# Altium footprint library PcbLibLafe.PcbLib: 294 footprints (part 12 of 19)
Each footprint in its own frame and in the unit in brackets; x right, y up, seen from the top. Pads: shape width x height; smd on the part's side, far side on the other; paste and mask are expansions set on the pad; w line width, h text height; cw(c..) or ccw(c..) is an arc to the next point about the centre after c.
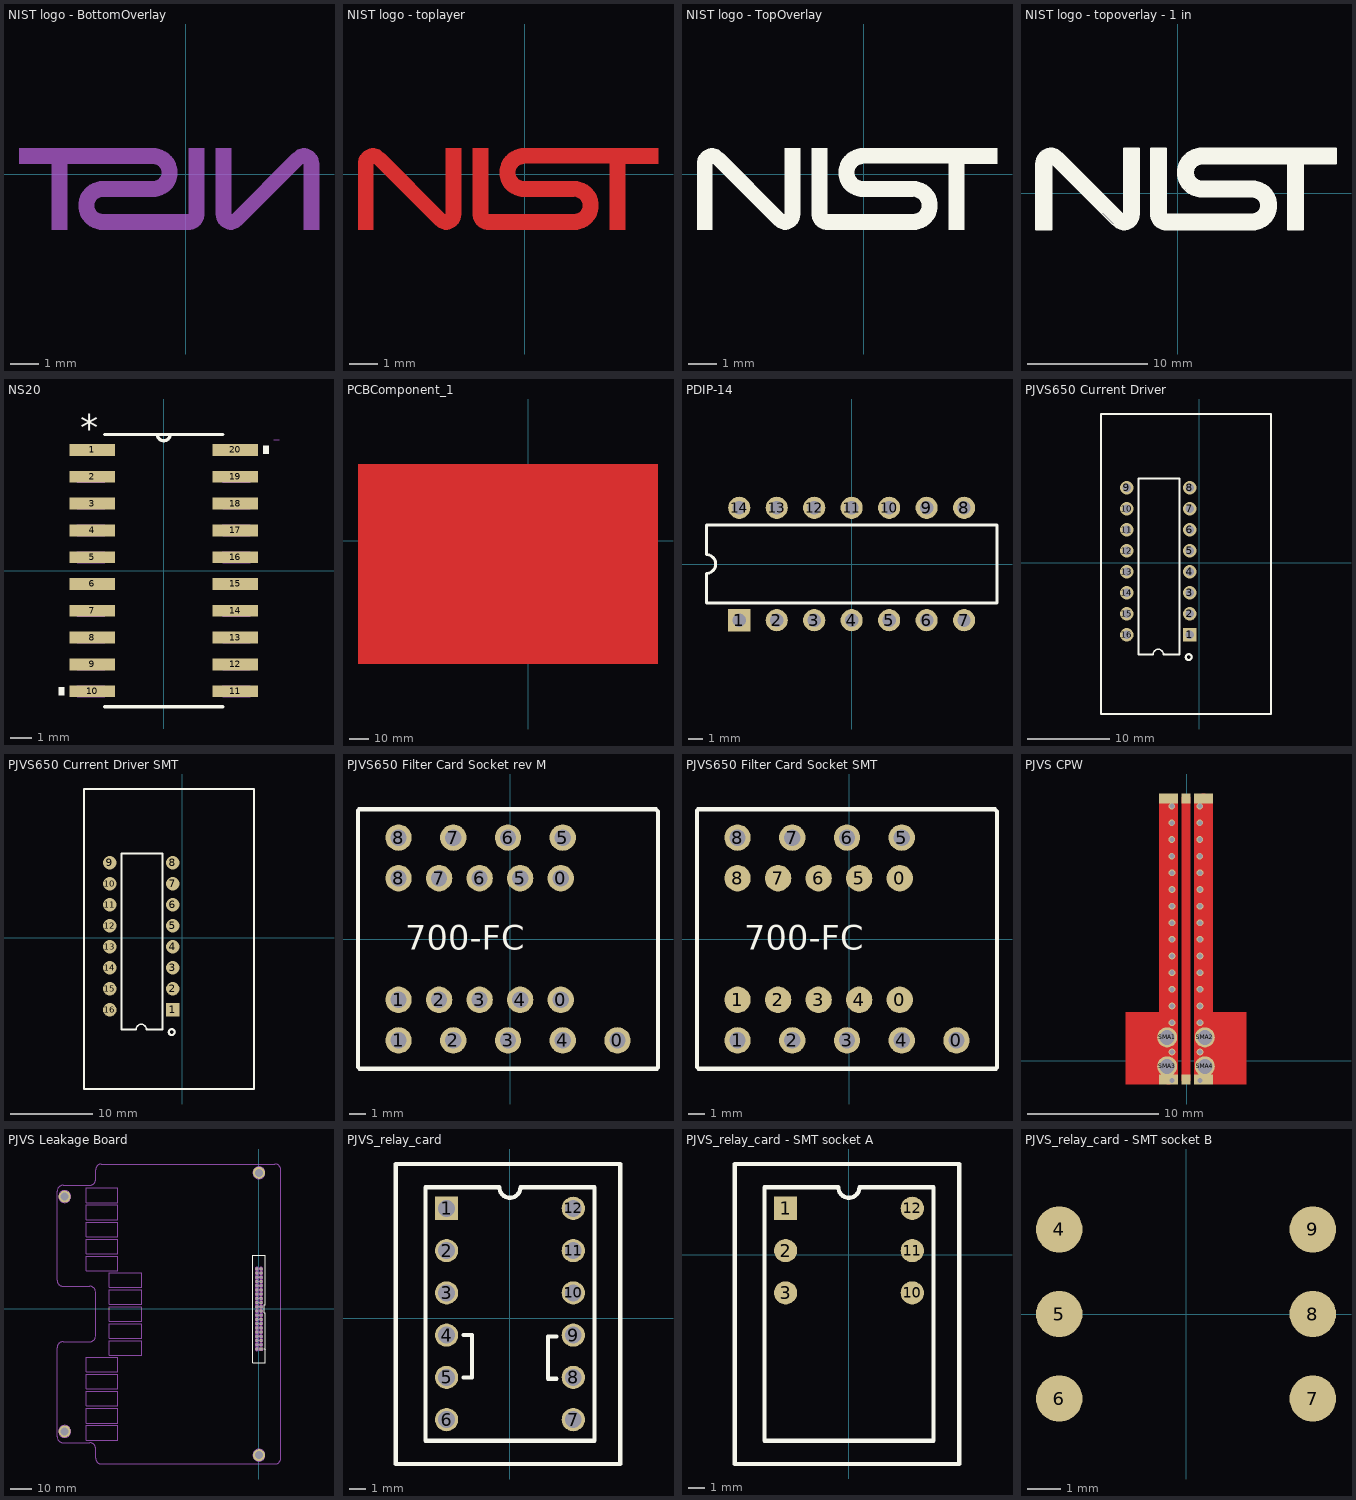
[diagram p11: the footprints below, top view; thin cyan lines are the x and y axes]

## NIST logo - BottomOverlay [mil]
Bottom Overlay:
  drawing of 3 lines, arcs and shapes, not listed

## NIST logo - toplayer [mil]
Top Layer:
  region: -204.1,35.26 -197.82,33.16 -194.53,30.77 -190.33,27.17 -108.73,-54.43 -108.69,-54.45 -86.7,-54.45 -86.76,-55.92 -86.93,-57.44 -87.2,-58.91 -87.56,-60.41 -88.04,-61.84 -88.64,-63.22 -89.3,-64.6 -90.08,-65.88 -90.94,-67.14 -91.9,-68.31 -92.92,-69.44 -94.06,-70.46 -95.22,-71.42 -96.48,-72.29 -97.77,-73.06 -99.14,-73.72 -100.52,-74.32 -101.96,-74.8 -103.45,-75.16 -104.92,-75.43 -106.44,-75.58 -109.58,-75.58 -113.26,-74.44 -117.96,-71.99 -123.51,-67.4 -205.04,14.11 -205.08,14.12 -205.98,14.12 -206.02,14.11 -206.04,14.07 -206.04,-75.64 -227.14,-75.64 -227.14,15.6 -227.02,17.09 -226.75,18.59 -226.36,20.05 -225.88,21.49 -225.31,22.89 -224.62,24.24 -223.85,25.56 -222.98,26.79 -222.05,27.98 -221,29.09 -219.9,30.14 -218.7,31.07 -217.47,31.93 -216.16,32.71 -214.81,33.4 -213.4,33.97 -211.97,34.45 -210.5,34.84 -209,35.11 -207.51,35.25 -205.98,35.31
  region: 489 vertices and 0 holes, not listed, extent -70.96,-75.64 181.41,35.4
  region: -86.7,-54.34 -107.89,-54.34 -107.89,35.4 -86.7,35.4

## NIST logo - TopOverlay [mil]
Top Overlay:
  drawing of 3 lines, arcs and shapes, not listed

## NIST logo - topoverlay - 1 in [mil]
Top Overlay:
  drawing of 419 lines, arcs and shapes, not listed

## NS20 [mil]
pads (20):
  rect 85x22 smd: 1(-133,225) 2(-133,175) 3(-133,125) 4(-133,75) 5(-133,25) 6(-133,-25) 7(-133,-75) 8(-133,-125) 9(-133,-175) 10(-133,-225) 11(133,-225) 12(133,-175) 13(133,-125) 14(133,-75) 15(133,-25) 16(133,25) 17(133,75) 18(133,125) 19(133,175) 20(133,225)
Top Overlay:
  region: -185.5,-217.5 -195.5,-217.5 -195.5,-232.5 -185.5,-232.5
  region: 185.5,232.5 195.5,232.5 195.5,217.5 185.5,217.5
  lines w6: -110,-254 110,-254 ; -110,254 110,254 ; -12,254 ccw(c0,254) 12,254
  text "*" at -155.5,242 h50
Mechanical 7:
  lines w1: 205,244 215,244
Mechanical 13:
  lines w0: -12,254 ccw(c0,254) 12,254
  lines w1: -110,254 110,254 ; -161.5,-235 -161.5,-215 -110,-215 -110,-235 -161.5,-235 ; -161.5,-185 -161.5,-165 -110,-165 -110,-185 -161.5,-185 ; -161.5,-135 -161.5,-115 -110,-115 -110,-135 -161.5,-135 ; -161.5,-85 -161.5,-65 -110,-65 -110,-85 -161.5,-85 ; -161.5,-35 -161.5,-15 -110,-15 -110,-35 -161.5,-35 ; -161.5,15 -161.5,35 -110,35 -110,15 -161.5,15 ; -161.5,65 -161.5,85 -110,85 -110,65 -161.5,65 ; -161.5,115 -161.5,135 -110,135 -110,115 -161.5,115 ; -161.5,165 -161.5,185 -110,185 -110,165 -161.5,165 ; -161.5,215 -161.5,235 -110,235 -110,215 -161.5,215 ; 110,-235 110,-215 161.5,-215 161.5,-235 110,-235 ; 110,-185 110,-165 161.5,-165 161.5,-185 110,-185 ; 110,-135 110,-115 161.5,-115 161.5,-135 110,-135 ; 110,-85 110,-65 161.5,-65 161.5,-85 110,-85 ; 110,-35 110,-15 161.5,-15 161.5,-35 110,-35 ; 110,15 110,35 161.5,35 161.5,15 110,15 ; 110,65 110,85 161.5,85 161.5,65 110,65 ; 110,115 110,135 161.5,135 161.5,115 110,115 ; 110,165 110,185 161.5,185 161.5,165 110,165 ; 110,215 110,235 161.5,235 161.5,215 110,215
  text "*" at -155.5,242 h50
3D body: height 10, standoff 0, extent 0,0 10,10
3D body "NS0020A.stp": height 78.74, standoff 0, extent -153.53,-248.03 153.55,248.04

## PCBComponent_1 [mil]
Top Layer:
  rectangle: -3500,-2530 2670,1580

## PDIP-14 [mm] "DIP; 14 Leads; Row Spacing 7.62 mm; Pitch 2.54 mm"
height 5.08
pads (14):
  rect 1.5x1.5 hole 0.9: 1(-7.62,-3.81)
  round 1.5 hole 0.9: 2(-5.08,-3.81) 3(-2.54,-3.81) 4(0,-3.81) 5(2.54,-3.81) 6(5.08,-3.81) 7(7.62,-3.81) 8(7.62,3.81) 9(5.08,3.81) 10(2.54,3.81) 11(0,3.81) 12(-2.54,3.81) 13(-5.08,3.81) 14(-7.62,3.81)
Top Overlay:
  lines w0.2: -9.85,-2.65 -9.85,-0.635 ccw(c-9.85,0) -9.85,0.635 -9.85,2.65 9.85,2.65 9.85,-2.65 -9.85,-2.65

## PJVS650 Current Driver [mil] "PJVS650 Current Driver Daughter board"
height 200
pads (16):
  rect 65x65 hole 40: 1(-45,-344)
  round 65 hole 40: 2(-45,-244) 3(-45,-144) 4(-45,-44) 5(-45,56) 6(-45,156) 7(-45,256) 8(-45,356) 9(-345,356) 10(-345,256) 11(-345,156) 12(-345,56) 13(-345,-44) 14(-345,-144) 15(-345,-244) 16(-345,-344)
Top Overlay:
  circle w10: c-50,-450 r14.14
  lines w7.87: -289,-437.8 -289,400 -94,400 -94,-437.8 -170,-437.8 ccw(c-195,-437.8) -220,-437.8 -289,-437.8
  lines w10: -467,-721 341,-721 341,707 -467,707 -467,-721
3D body "110-xx-316-41-001000.STEP": height 119.84, standoff 10, extent -382.64,-414 15,385.21
3D body "CurrentDriverAssembly.SLDPRT": height 212.02, standoff -17.07, extent -464,-717 336,703

## PJVS650 Current Driver SMT [mil] "PJVS650 Current Driver Daughter board SMT"
height 200
pads (16):
  rect 65x65 smd: 1(-45,-344)
  round 65 smd: 2(-45,-244) 3(-45,-144) 4(-45,-44) 5(-45,56) 6(-45,156) 7(-45,256) 8(-45,356) 9(-345,356) 10(-345,256) 11(-345,156) 12(-345,56) 13(-345,-44) 14(-345,-144) 15(-345,-244) 16(-345,-344)
Top Overlay:
  circle w10: c-50,-450 r14.14
  lines w7.87: -289,-437.8 -220,-437.8 cw(c-195,-437.8) -170,-437.8 -94,-437.8 -94,400 -289,400 -289,-437.8
  lines w10: -467,-721 -467,707 341,707 341,-721 -467,-721
3D body "CurrentDriverAssembly.SLDPRT": height 212.02, standoff -17.07, extent -464,-717 336,703
3D body "110-xx-316-41-001000.STEP": height 119.84, standoff 10, extent -382.64,-414 15,385.21

## PJVS650 Filter Card Socket rev M [mil] "PJVS650 Filter Card Socket rev M"
height 200
pads (19):
  round 65 hole 40: 0(125,-150) 0(125,150) 0(265,-250) 1(-275,-250) 1(-275,-150) 2(-175,-150) 2(-140,-250) 3(-75,-150) 3(-5,-250) 4(25,-150) 4(130,-250) 5(25,150) 5(130,250) 6(-75,150) 6(-5,250) 7(-175,150) 7(-140,250) 8(-275,150) 8(-275,250)
Top Overlay:
  lines w10: -375,-316 -371,-320 362,-320 365,-317 365,315 360,320 -372,320 -375,317 -375,-316
  text "700-FC" at -259,-26 h60
3D body "650-RCF1 simplified model.sldprt": height 102, standoff -178, extent -376,-320 364,320

## PJVS650 Filter Card Socket SMT [mil] "PJVS650 Filter Card Socket with SMT"
height 200
pads (19):
  round 65 smd: 0(125,-150) 0(125,150) 1(-275,-150) 2(-175,-150) 3(-75,-150) 4(25,-150) 5(25,150) 6(-75,150) 7(-175,150) 8(-275,150)
  round 65 hole 40: 0(265,-250) 1(-275,-250) 2(-140,-250) 3(-5,-250) 4(130,-250) 5(130,250) 6(-5,250) 7(-140,250) 8(-275,250)
Top Overlay:
  lines w10: -375,-316 -375,317 -372,320 360,320 365,315 365,-317 362,-320 -371,-320 -375,-316
  text "700-FC" at -259,-26 h60
3D body "650-RCF1 simplified model.sldprt": height 102, standoff -178, extent -376,-320 364,320

## PJVS CPW [mil] "single straight cpw"
pads (10):
  round 60 hole 45: SMA1(-58.03,70) SMA3(-58.03,-17) SMA4(54.97,-17)
  round 60 hole 45 paste-99999: SMA2(54.97,70)
  rect 57x30 smd mask+0: ""(-54.03,-56.5) ""(-54.03,787) ""(50.97,-56.5) ""(50.97,787)
  rect 28x30 smd mask+0: ""(-1.53,-56.5)
  rect 28x30 smd paste+0 mask+0: ""(-1.53,787)
via 40,614 diameter 20 hole 15
via -44,614 diameter 20 hole 15
via -43.53,364 diameter 20 hole 15
via 40.47,114 diameter 20 hole 15
via 40.47,164 diameter 20 hole 15
via 40.47,214 diameter 20 hole 15
via 40.47,314 diameter 20 hole 15
via 40.47,264 diameter 20 hole 15
via 40.47,364 diameter 20 hole 15
via 40.47,414 diameter 20 hole 15
via 40.47,464 diameter 20 hole 15
via 40.47,514 diameter 20 hole 15
via 40.47,564 diameter 20 hole 15
via -43.53,114 diameter 20 hole 15
via -43.53,164 diameter 20 hole 15
via -43.53,214 diameter 20 hole 15
via -43.53,264 diameter 20 hole 15
via -43.53,314 diameter 20 hole 15
via -43.53,414 diameter 20 hole 15
via -43.53,464 diameter 20 hole 15
via -43.53,514 diameter 20 hole 15
via -43.53,564 diameter 20 hole 15
via -43.53,26 diameter 20 hole 15
via -43.53,-59 diameter 20 hole 15
via 40.47,-59 diameter 20 hole 15
via 40.47,26 diameter 20 hole 15
via -44,664 diameter 20 hole 15
via 40,664 diameter 20 hole 15
via -44,714 diameter 20 hole 15
via 40,714 diameter 20 hole 15
via -44,764 diameter 20 hole 15
via 40,764 diameter 20 hole 15
Top Layer:
  rectangle: -182.53,-71.5 -82.53,146.5
  rectangle: 79.47,-71.5 179.47,146.5
  lines w28: -1.53,-56.5 -1.53,787.06
  lines w57: -54.03,-42.5 -54.03,772 ; 50.97,-41.5 50.97,773
Mid-Layer 1:
  rectangle: -171,-66.5 167.97,146.5
  rectangle: -82.5,-66.5 79.47,797
Top Solder:
  rectangle: -182.53,-71.5 179.5,146.5
  rectangle: -82.5,146.5 79.5,802

## PJVS Leakage Board [mil] "JVS650 Automated Leakage Board"
pads (44):
  rect 55x55 hole 40: 1(40,-750)
  round 55 hole 40: 2(-39,-750) 3(40,-671) 4(-39,-671) 5(40,-592) 6(-39,-592) 7(40,-513) 8(-39,-513) 9(40,-434) 10(-39,-434) 11(40,-355) 12(-39,-355) 13(40,-276) 14(-39,-276) 15(40,-197) 16(-39,-197) 17(40,-118) 18(-39,-118) 19(40,-39) 20(-39,-39) 21(40,40) 22(-39,40) 23(40,119) 24(-39,119) 25(40,198) 26(-39,198) 27(40,277) 28(-39,277) 29(40,356) 30(-39,356) 31(40,435) 32(-39,435) 33(40,514) 34(-39,514) 35(40,593) 36(-39,593) 37(40,672) 38(-39,672) 39(40,751) 40(-39,751)
  round 225 hole 150: ""(-3640,-2295) ""(-3640,2105) ""(0,-2740) ""(0,2550)
Top Overlay:
  lines w10: 118,1010 -120,1010 -120,-1010 120,-1010 120,-75 96,-75 96,75 120,75 120,1010 ; 119,-762.5 91,-750.5 119,-737.5
Mechanical 3:
  drawing of 175 lines, arcs and shapes, not listed
3D body "155240-6XX0.stp": height 358, standoff -137, extent -172.37,-979.62 147.63,1031.68

## PJVS_relay_card [mil] "PJVS relay card"
pads (12):
  rect 55x55 hole 40: 1(-150,260)
  round 55 hole 40: 2(-150,160) 3(-150,60) 4(-150,-40) 5(-150,-140) 6(-150,-240) 7(150,-240) 8(150,-140) 9(150,-40) 10(150,60) 11(150,160) 12(150,260)
Top Overlay:
  lines w10: -110,-140 -90,-140 -90,-40 -110,-40 ; 110,-143 90,-143 90,-43 110,-43 ; -270,-345 -270,365 261,365 261,-345 -270,-345 ; -200,-290 -200,310 -25,310 ccw(c0,310) 25,310 200,310 200,-290 -200,-290
3D body "110-87-312-41-001101.stp": height 110.28, standoff -179.92, extent -199.21,-294.92 198.43,303.5
3D body "relay_daughter_assm.SLDPRT": height 615.21, standoff -13.4, extent -272,-343 258,367

## PJVS_relay_card - SMT socket A [mil] "PJVS relay card"
pads (6):
  rect 55x55 smd: 1(-150,110)
  round 55 smd: 2(-150,10) 3(-150,-90) 10(150,-90) 11(150,10) 12(150,110)
Top Overlay:
  lines w10: -270,-495 261,-495 261,215 -270,215 -270,-495 ; -200,-440 200,-440 200,160 25,160 cw(c0,160) -25,160 -200,160 -200,-440
3D body "relay_daughter_assm.SLDPRT": height 615.21, standoff -13.4, extent -272,-493 258,217
3D body "110-87-312-41-001101.stp": height 110.28, standoff -179.92, extent -199.21,-444.92 198.43,153.5

## PJVS_relay_card - SMT socket B [mil] "PJVS relay card"
pads (6):
  round 55 smd: 4(-150,100) 5(-150,0) 6(-150,-100) 7(150,-100) 8(150,0) 9(150,100)